# Altium footprint library Connectors.PcbLib: 68 footprints (part 3 of 5)
Each footprint in its own frame and in the unit in brackets; x right, y up, seen from the top. Pads: shape width x height; smd on the part's side, far side on the other; paste and mask are expansions set on the pad; w line width, h text height; cw(c..) or ccw(c..) is an arc to the next point about the centre after c.
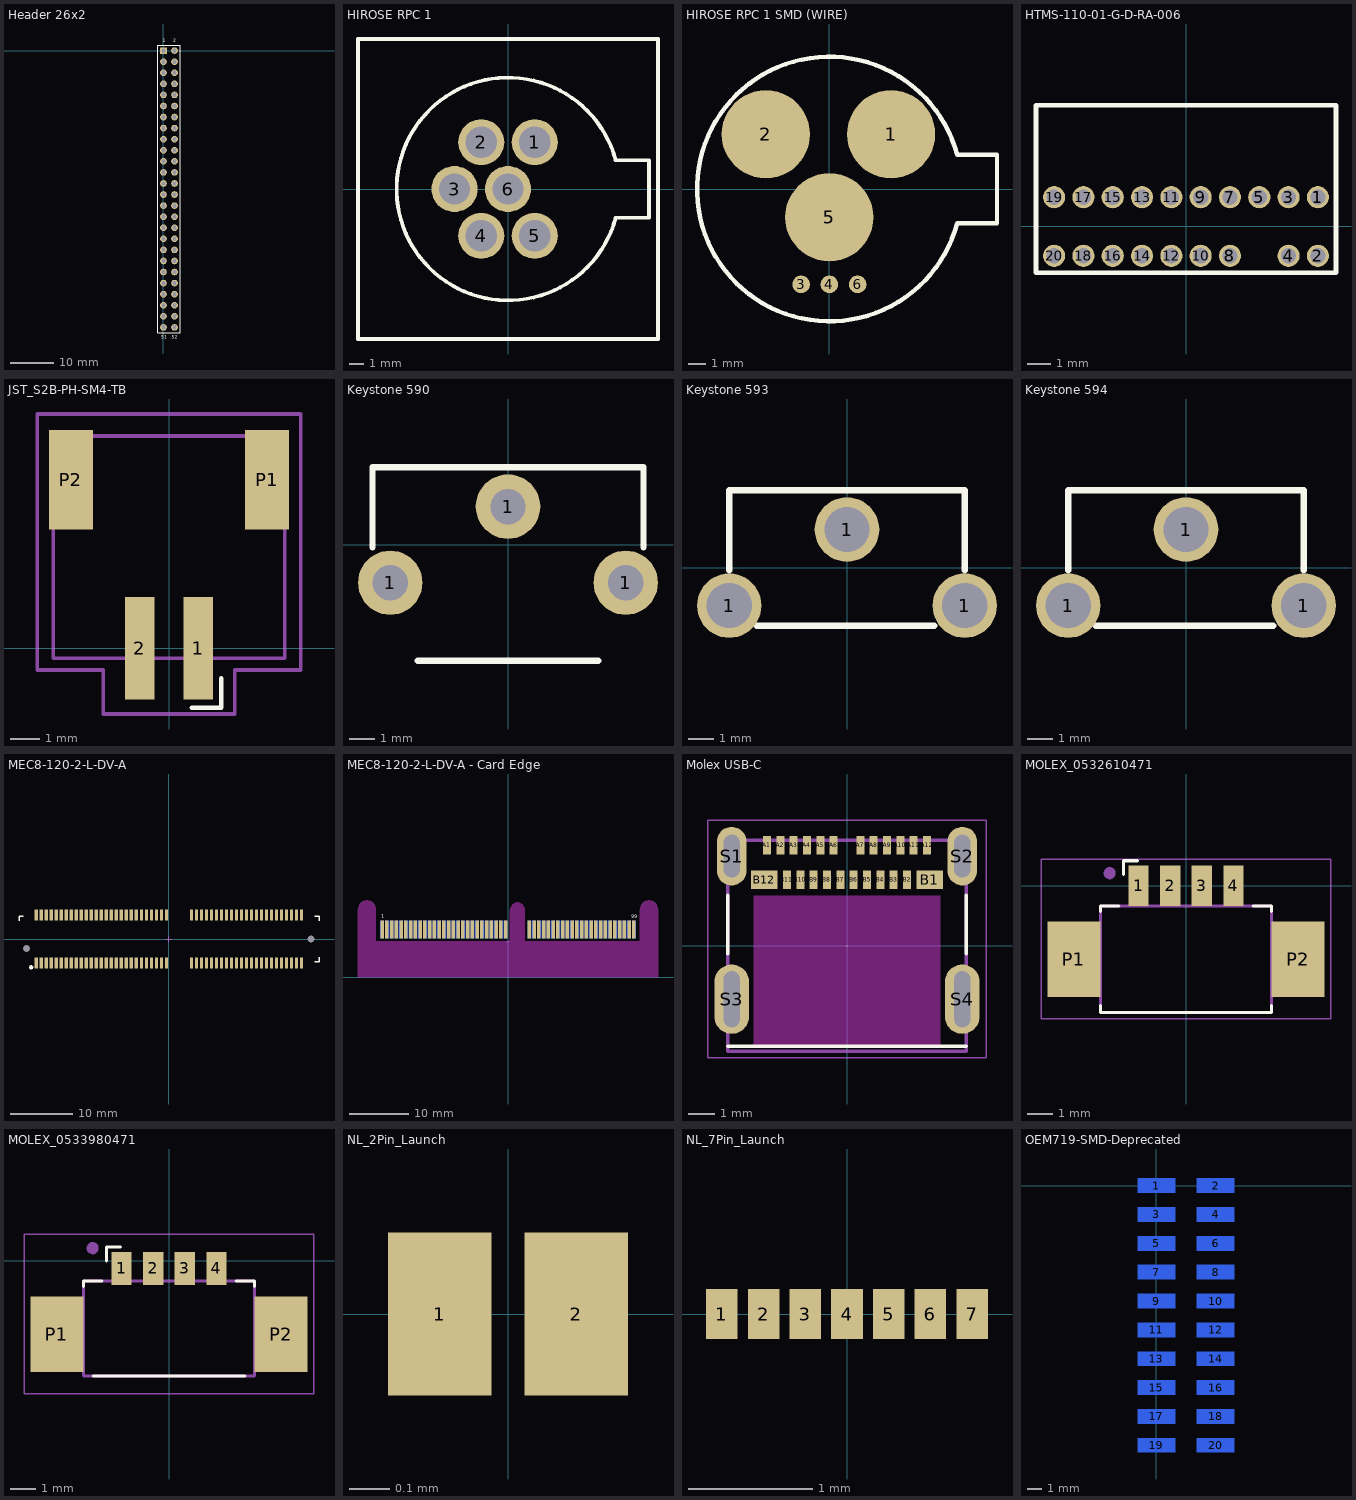
[diagram p2: the footprints below, top view; thin cyan lines are the x and y axes]

## Header 26x2 [mil]
pads (52):
  rect 60x60 hole 40: 1(0,0)
  round 60 hole 40: 2(100,0) 3(0,-100) 4(100,-100) 5(0,-200) 6(100,-200) 7(0,-300) 8(100,-300) 9(0,-400) 10(100,-400) 11(0,-500) 12(100,-500) 13(0,-600) 14(100,-600) 15(0,-700) 16(100,-700) 17(0,-800) 18(100,-800) 19(0,-900) 20(100,-900) 21(0,-1000) 22(100,-1000) 23(0,-1100) 24(100,-1100) 25(0,-1200) 26(100,-1200) 27(0,-1300) 28(100,-1300) 29(0,-1400) 30(100,-1400) 31(0,-1500) 32(100,-1500) 33(0,-1600) 34(100,-1600) 35(0,-1700) 36(100,-1700) 37(0,-1800) 38(100,-1800) 39(0,-1900) 40(100,-1900) 41(0,-2000) 42(100,-2000) 43(0,-2100) 44(100,-2100) 45(0,-2200) 46(100,-2200) 47(0,-2300) 48(100,-2300) 49(0,-2400) 50(100,-2400) 51(0,-2500) 52(100,-2500)
Top Overlay:
  lines w10: -50,-2550 150,-2550 150,50 -50,50 -50,-2550
  text "52" at 75,-2605 h30
  text "51" at -20,-2605 h30
  text "1" at -5,75 h30
  text "2" at 90,75 h30
3D body "ESQ-126-49-G-D.stp": height 535, standoff -380, extent -50,-2560 150,60

## HIROSE RPC 1 [mm] "6 Pin JBC Connector"
pads (6):
  round 3.1 hole 2.1: 1(1.8,3.15) 2(-1.8,3.15) 3(-3.6,0) 4(-1.8,-3.15) 5(1.8,-3.15) 6(0,0)
Top Overlay:
  lines w0.254: -10.1,-10.1 10.1,-10.1 10.1,10.1 -10.1,10.1 -10.1,-10.1 ; 7.244,-1.941 cw(c0,0) 7.244,1.941 9.5,1.941 9.5,-1.941 7.244,-1.941
Top Assy Drawing:
  lines w0.254: -10.1,-10.1 -10.1,10.1 10.1,10.1 10.1,-10.1 -10.1,-10.1
3D body "RPC1-12RB-6P v3.step": height 15.71, standoff -6.49, extent -10.1,-10.1 10.1,10.1

## HIROSE RPC 1 SMD (WIRE) [mm] "6 Pin JBC Connector"
pads (6):
  round 5 smd: 1(3.5,3.1) 2(-3.6,3.1) 5(0,-1.6)
  round 1 smd: 3(-1.6,-5.4) 4(0,-5.4) 6(1.6,-5.4)
Top Overlay:
  lines w0.254: 7.244,-1.941 cw(c0,0) 7.244,1.941 9.5,1.941 9.5,-1.941 7.244,-1.941

## HTMS-110-01-G-D-RA-006 [mm] ".050\" X .100\" High-Temp Through-hole Micro Terminal Strip"
height 5
pads (19):
  round 0.96 hole 0.66: 1(5.715,1.27) 2(5.715,-1.27) 3(4.445,1.27) 4(4.445,-1.27) 5(3.175,1.27) 7(1.905,1.27) 8(1.905,-1.27) 9(0.635,1.27) 10(0.635,-1.27) 11(-0.635,1.27) 12(-0.635,-1.27) 13(-1.905,1.27) 14(-1.905,-1.27) 15(-3.175,1.27) 16(-3.175,-1.27) 17(-4.445,1.27) 18(-4.445,-1.27) 19(-5.715,1.27) 20(-5.715,-1.27)
Top Overlay:
  lines w0.2: -6.5,-2 -6.5,5.25 6.5,5.25 6.5,-2 -6.5,-2
3D body "HTMS-110-01-G-D-RA-006.stp": height 4.99, standoff -3.55, extent -6.35,-1.5 6.35,11.2

## JST_S2B-PH-SM4-TB [mm]
pads (4):
  rect 1x3.5 smd: 1(1,0) 2(-1,0)
  rect 1.5x3.4 smd: P1(3.35,5.75) P2(-3.35,5.75)
Top Overlay:
  lines w0.152: 0.778,-2.032 1.778,-2.032 1.778,-1.032
3D Bodies:
  lines w0.127: -3.95,-0.35 -3.95,7.25 3.95,7.25 3.95,-0.35 -3.95,-0.35
Component Info:
  lines w0.127: -4.5,-0.75 -4.5,8 4.5,8 4.5,-0.75 2.25,-0.75 2.25,-2.25 -2.25,-2.25 -2.25,-0.75 -4.5,-0.75
3D body "S2B-PH-SM4-TB.step": height 5.61, standoff 0.01, extent -3.95,-1.35 3.95,7.25

## Keystone 590 [mil] "9V Spring Battery Clip"
height 118.11
pads (3):
  round 100 hole 55: 1(-182.5,-59) 1(0,59) 1(182.5,-59)
Top Overlay:
  lines w10: -210,-3.94 -210,120.08 210,120.08 210,-3.94 ; -140,-180 140,-180
3D body "keystone-PN590.STEP": height 501.45, standoff -152.5, extent -209.56,-185 208.56,224.8

## Keystone 593 [mil] "9V Battery Clip Male"
height 118.11
pads (3):
  round 100 hole 70: 1(-182.5,-59) 1(0,59) 1(182.5,-59)
Top Overlay:
  lines w10: -182.5,-3.94 -182.5,120.08 182.5,120.08 182.5,-3.94 ; -140,-90 135,-90
3D body "keystone-PN593 v2.step": height 554.59, standoff -115.41, extent -190.32,-87.5 189.68,208.5

## Keystone 594 [mil] "9V Battery Clip Female"
height 118.11
pads (3):
  round 100 hole 70: 1(-182.5,-59) 1(0,59) 1(182.5,-59)
Top Overlay:
  lines w10: -182.5,-3.94 -182.5,120.08 182.5,120.08 182.5,-3.94 ; -140,-90 135,-90
3D body "keystone-PN594 v2.step": height 551.5, standoff -118.5, extent -190.25,-89.56 189.75,216.23

## MEC8-120-2-L-DV-A [mm]
pads (102):
  rect 0.5x1.8 smd: 1(-21.2,-3.85) 2(-21.2,3.85) 3(-20.4,-3.85) 4(-20.4,3.85) 5(-19.6,-3.85) 6(-19.6,3.85) 7(-18.8,-3.85) 8(-18.8,3.85) 9(-18,-3.85) 10(-18,3.85) 11(-17.2,-3.85) 12(-17.2,3.85) 13(-16.4,-3.85) 14(-16.4,3.85) 15(-15.6,-3.85) 16(-15.6,3.85) 17(-14.8,-3.85) 18(-14.8,3.85) 19(-14,-3.85) 20(-14,3.85) 21(-13.2,-3.85) 22(-13.2,3.85) 23(-12.4,-3.85) 24(-12.4,3.85) 25(-11.6,-3.85) 26(-11.6,3.85) 27(-10.8,-3.85) 28(-10.8,3.85) 29(-10,-3.85) 30(-10,3.85) 31(-9.2,-3.85) 32(-9.2,3.85) 33(-8.4,-3.85) 34(-8.4,3.85) 35(-7.6,-3.85) 36(-7.6,3.85) 37(-6.8,-3.85) 38(-6.8,3.85) 39(-6,-3.85) 40(-6,3.85) 41(-5.2,-3.85) 42(-5.2,3.85) 43(-4.4,-3.85) 44(-4.4,3.85) 45(-3.6,-3.85) 46(-3.6,3.85) 47(-2.8,-3.85) 48(-2.8,3.85) 49(-2,-3.85) 50(-2,3.85) 51(-1.2,-3.85) 52(-1.2,3.85) 53(-0.4,-3.85) 54(-0.4,3.85) 55(3.6,-3.85) 56(3.6,3.85) 57(4.4,-3.85) 58(4.4,3.85) 59(5.2,-3.85) 60(5.2,3.85) 61(6,-3.85) 62(6,3.85) 63(6.8,-3.85) 64(6.8,3.85) 65(7.6,-3.85) 66(7.6,3.85) 67(8.4,-3.85) 68(8.4,3.85) 69(9.2,-3.85) 70(9.2,3.85) 71(10,-3.85) 72(10,3.85) 73(10.8,-3.85) 74(10.8,3.85) 75(11.6,-3.85) 76(11.6,3.85) 77(12.4,-3.85) 78(12.4,3.85) 79(13.2,-3.85) 80(13.2,3.85) 81(14,-3.85) 82(14,3.85) 83(14.8,-3.85) 84(14.8,3.85) 85(15.6,-3.85) 86(15.6,3.85) 87(16.4,-3.85) 88(16.4,3.85) 89(17.2,-3.85) 90(17.2,3.85) 91(18,-3.85) 92(18,3.85) 93(18.8,-3.85) 94(18.8,3.85) 95(19.6,-3.85) 96(19.6,3.85) 97(20.4,-3.85) 98(20.4,3.85) 99(21.2,-3.85) 100(21.2,3.85)
  rect 0x0 hole 1.1 unplated: H(-22.75,-1.5) H(22.75,0)
Top Overlay:
  circle w0.254: c-22,-4.525 r0.214
  circle w0.254: c-22,-4.525 r0.09
  lines w0.2: -23.95,2.9 -23.95,3.6 -23.25,3.6 ; 23.3,-3.6 24,-3.6 24,-2.9 ; 23.3,3.6 24,3.6 24,2.9
Top Assy Drawing:
  text ".Designator" at 15.71,2.205 h1.27
Component Info:
  lines w0.1: -0.5,0 0,0 ; 0,-0.5 0,0 ; 0,0.5 0,0 ; 0.5,0 0,0
3D body "MEC8-150-02-L-DV-A.stp": height 8.64, standoff -1.36, extent -23.9,-4.4 23.9,4.4

## MEC8-120-2-L-DV-A - Card Edge [mm]
pads (100):
  rect 0.6x3 smd: 1(-21.2,8) 3(-20.4,8) 5(-19.6,8) 7(-18.8,8) 9(-18,8) 11(-17.2,8) 13(-16.4,8) 15(-15.6,8) 17(-14.8,8) 19(-14,8) 21(-13.2,8) 23(-12.4,8) 25(-11.6,8) 27(-10.8,8) 29(-10,8) 31(-9.2,8) 33(-8.4,8) 35(-7.6,8) 37(-6.8,8) 39(-6,8) 41(-5.2,8) 43(-4.4,8) 45(-3.6,8) 47(-2.8,8) 49(-2,8) 51(-1.2,8) 53(-0.4,8) 55(3.6,8) 57(4.4,8) 59(5.2,8) 61(6,8) 63(6.8,8) 65(7.6,8) 67(8.4,8) 69(9.2,8) 71(10,8) 73(10.8,8) 75(11.6,8) 77(12.4,8) 79(13.2,8) 81(14,8) 83(14.8,8) 85(15.6,8) 87(16.4,8) 89(17.2,8) 91(18,8) 93(18.8,8) 95(19.6,8) 97(20.4,8) 99(21.2,8)
  rect 0.6x3 smd far side: 2(-21.2,8) 4(-20.4,8) 6(-19.6,8) 8(-18.8,8) 10(-18,8) 12(-17.2,8) 14(-16.4,8) 16(-15.6,8) 18(-14.8,8) 20(-14,8) 22(-13.2,8) 24(-12.4,8) 26(-11.6,8) 28(-10.8,8) 30(-10,8) 32(-9.2,8) 34(-8.4,8) 36(-7.6,8) 38(-6.8,8) 40(-6,8) 42(-5.2,8) 44(-4.4,8) 46(-3.6,8) 48(-2.8,8) 50(-2,8) 52(-1.2,8) 54(-0.4,8) 56(3.6,8) 58(4.4,8) 60(5.2,8) 62(6,8) 64(6.8,8) 66(7.6,8) 68(8.4,8) 70(9.2,8) 72(10,8) 74(10.8,8) 76(11.6,8) 78(12.4,8) 80(13.2,8) 82(14,8) 84(14.8,8) 86(15.6,8) 88(16.4,8) 90(17.2,8) 92(18,8) 94(18.8,8) 96(19.6,8) 98(20.4,8) 100(21.2,8)
Top Overlay:
  text "1" at -21.375,9.725 h1.02
  text "99" at 20.775,9.675 h1.02
Bottom Overlay:
  text "2" at -20.975,9.725 h1.02
  text "100" at 21.95,9.675 h1.02
Top Solder:
  rectangle: 2.805,6 22.225,9.652
  rectangle: -22.225,6 0.405,9.652
Bottom Solder:
  rectangle: 2.805,6 22.225,9.652
  rectangle: -22.225,6 0.405,9.652
Keep-Out Layer:
  board cut-out: -25.25,0 -25.25,11.3 -25.25,11.449 -25.192,11.741 -25.078,12.016 -24.912,12.264 -24.702,12.475 -24.454,12.64 -24.179,12.754 -23.886,12.812 -23.589,12.812 -23.296,12.754 -23.021,12.64 -22.773,12.475 -22.563,12.264 -22.397,12.016 -22.283,11.741 -22.225,11.449 -22.225,11.3 -22.225,6 0.405,6 0.405,11.3 0.405,11.458 0.487,11.763 0.645,12.037 0.868,12.26 1.142,12.418 1.447,12.5 1.763,12.5 2.068,12.418 2.342,12.26 2.565,12.037 2.723,11.763 2.805,11.458 2.805,11.3 2.805,6 22.225,6 22.225,11.3 22.225,11.449 22.283,11.741 22.397,12.016 22.563,12.264 22.773,12.475 23.021,12.64 23.296,12.754 23.589,12.812 23.886,12.812 24.179,12.754 24.454,12.64 24.702,12.475 24.912,12.264 25.078,12.016 25.192,11.741 25.25,11.449 25.25,11.3 25.25,0
Keep-Out Layer:
  lines w0.2: -25.25,0 -25.25,11.3 cw(c-23.737,11.3) -22.225,11.3 -22.225,6 0.405,6 0.405,11.3 cw(c1.605,11.3) 2.805,11.3 2.805,6 22.225,6 22.225,11.3 cw(c23.737,11.3) 25.25,11.3 25.25,0
Component Info:
  lines w0.2: -0.25,6 0,6 0.25,6

## Molex USB-C [mm] "MOLEX_105450-0101"
pads (28):
  rect 0.3x0.7 smd: A1(-3,3.77) A2(-2.5,3.77) A3(-2,3.77) A4(-1.5,3.77) A5(-1,3.77) A6(-0.5,3.77) A7(0.5,3.77) A8(1,3.77) A9(1.5,3.77) A10(2,3.77) A11(2.5,3.77) A12(3,3.77) B2(2.25,2.47) B3(1.75,2.47) B4(1.25,2.47) B5(0.75,2.47) B6(0.25,2.47) B7(-0.25,2.47) B8(-0.75,2.47) B9(-1.25,2.47) B10(-1.75,2.47) B11(-2.25,2.47)
  rect 1x0.7 smd: B1(3.1,2.47) B12(-3.1,2.47)
  oval 1.1x2.2 hole 0.6 slot 1.6 at 90 deg: S1(-4.32,3.36) S2(4.32,3.36)
  oval 1.3x2.6 hole 0.6 slot 2.1 at 90 deg: S3(-4.32,-2) S4(4.32,-2)
Top Overlay:
  lines w0.127: -4.47,-3.77 4.47,-3.77 ; -4.47,-0.3 -4.47,1.9 ; 4.47,-0.3 4.47,1.9
Keep-Out Layer:
  region: 3.5,-3.773 -3.502,-3.773 -3.502,1.88 3.5,1.88
  region: 3.5,-3.771 -3.501,-3.771 -3.501,1.88 3.5,1.88
3D Bodies:
  lines w0.127: -4.47,-3.95 -4.47,3.95 4.47,3.95 4.47,-3.95 -4.47,-3.95
Component Info:
  lines w0.05: -5.22,-4.2 -5.22,4.71 5.22,4.71 5.22,-4.2 -5.22,-4.2
3D body "Molex USB C v3.step": height 3.22, standoff -0.74, extent -4.44,-3.92 4.5,3.98

## MOLEX_0532610471 [mm]
pads (6):
  rect 0.8x1.6 smd: 1(-1.875,0) 2(-0.625,0) 3(0.625,0) 4(1.875,0)
  rect 2.1x3 smd: P1(-4.425,-2.9) P2(4.425,-2.9)
Top Overlay:
  lines w0.127: -3.375,-4.725 -3.375,-5 3.375,-5 3.375,-4.725 ; -3.375,-1 -3.375,-0.8 -2.65,-0.8 ; -2.466,0.443 -2.466,0.993 -1.916,0.993 ; 2.65,-0.8 3.375,-0.8 3.375,-1
3D Bodies:
  circle w0.24: c-3.015,0.5 r0.12
  lines w0.127: -3.375,-5 -3.375,-0.8 3.375,-0.8 3.375,-5 -3.375,-5
Component Info:
  lines w0.05: -5.725,-5.25 5.725,-5.25 5.725,1.05 -5.725,1.05 -5.725,-5.25
3D body "step_temp.STEP": height 3.4, standoff -0.05, extent -5.075,-5 5.075,0.2

## MOLEX_0533980471 [mm]
pads (6):
  rect 0.8x1.3 smd: 1(-1.875,-0.3) 2(-0.625,-0.3) 3(0.625,-0.3) 4(1.875,-0.3)
  rect 2.1x3 smd: P1(-4.425,-2.9) P2(4.425,-2.9)
Top Overlay:
  lines w0.127: -3.375,-1 -3.375,-0.8 -2.65,-0.8 ; -3,-4.55 3,-4.55 ; -2.466,-0.007 -2.466,0.543 -1.916,0.543 ; 2.65,-0.8 3.375,-0.8 3.375,-1
3D Bodies:
  circle w0.24: c-3.015,0.5 r0.12
  lines w0.127: -3.375,-4.55 -3.375,-0.8 3.375,-0.8 3.375,-4.55 -3.375,-4.55
Component Info:
  lines w0.05: -5.725,-5.25 5.725,-5.25 5.725,1.05 -5.725,1.05 -5.725,-5.25
3D body "533980471.step": height 4.71, standoff -0.04, extent -5.075,-4.267 5.075,-0.067

## NL_2Pin_Launch [mm] "Neuralink 2 Pin 010015 Launch"
pads (2):
  rect 0.254x0.4 smd paste-1: 1(-0.167,0) 2(0.167,0)

## NL_7Pin_Launch [mm] "Neuralink 7 Pin 010015 Launch"
pads (7):
  rect 0.254x0.4 smd paste-1: 1(-1.004,0) 2(-0.669,0) 3(-0.335,0) 4(0,0) 5(0.335,0) 6(0.669,0) 7(1.004,0)

## OEM719-SMD-Deprecated [mm] "OEM719 [EXLUDES MOUNTING HOLES] (bottom layer) SMD 2x10 connector for GPS. Part no: 57202-G52-10LF"
height 6.5
pads (20):
  rect 2.6x1 smd far side: 1(0,0) 2(4.1,0) 3(0,-2) 4(4.1,-2) 5(0,-4) 6(4.1,-4) 7(0,-6) 8(4.1,-6) 9(0,-8) 10(4.1,-8) 11(0,-10) 12(4.1,-10) 13(0,-12) 14(4.1,-12) 15(0,-14) 16(4.1,-14) 17(0,-16) 18(4.1,-16) 19(0,-18) 20(4.1,-18)
Bottom Overlay:
  lines w0.2: 1.55,1 ccw(c2.05,1) 2.55,1 1.965,1 1.965,-19 2.135,-19 2.135,1 1.55,1
  text ".Designator" at 9.65,2.4 h1.52